# Altium footprint library cool_library.PcbLib: 1182 footprints (part 29 of 75)
Each footprint in its own frame and in the unit in brackets; x right, y up, seen from the top. Pads: shape width x height; smd on the part's side, far side on the other; paste and mask are expansions set on the pad; w line width, h text height; cw(c..) or ccw(c..) is an arc to the next point about the centre after c.
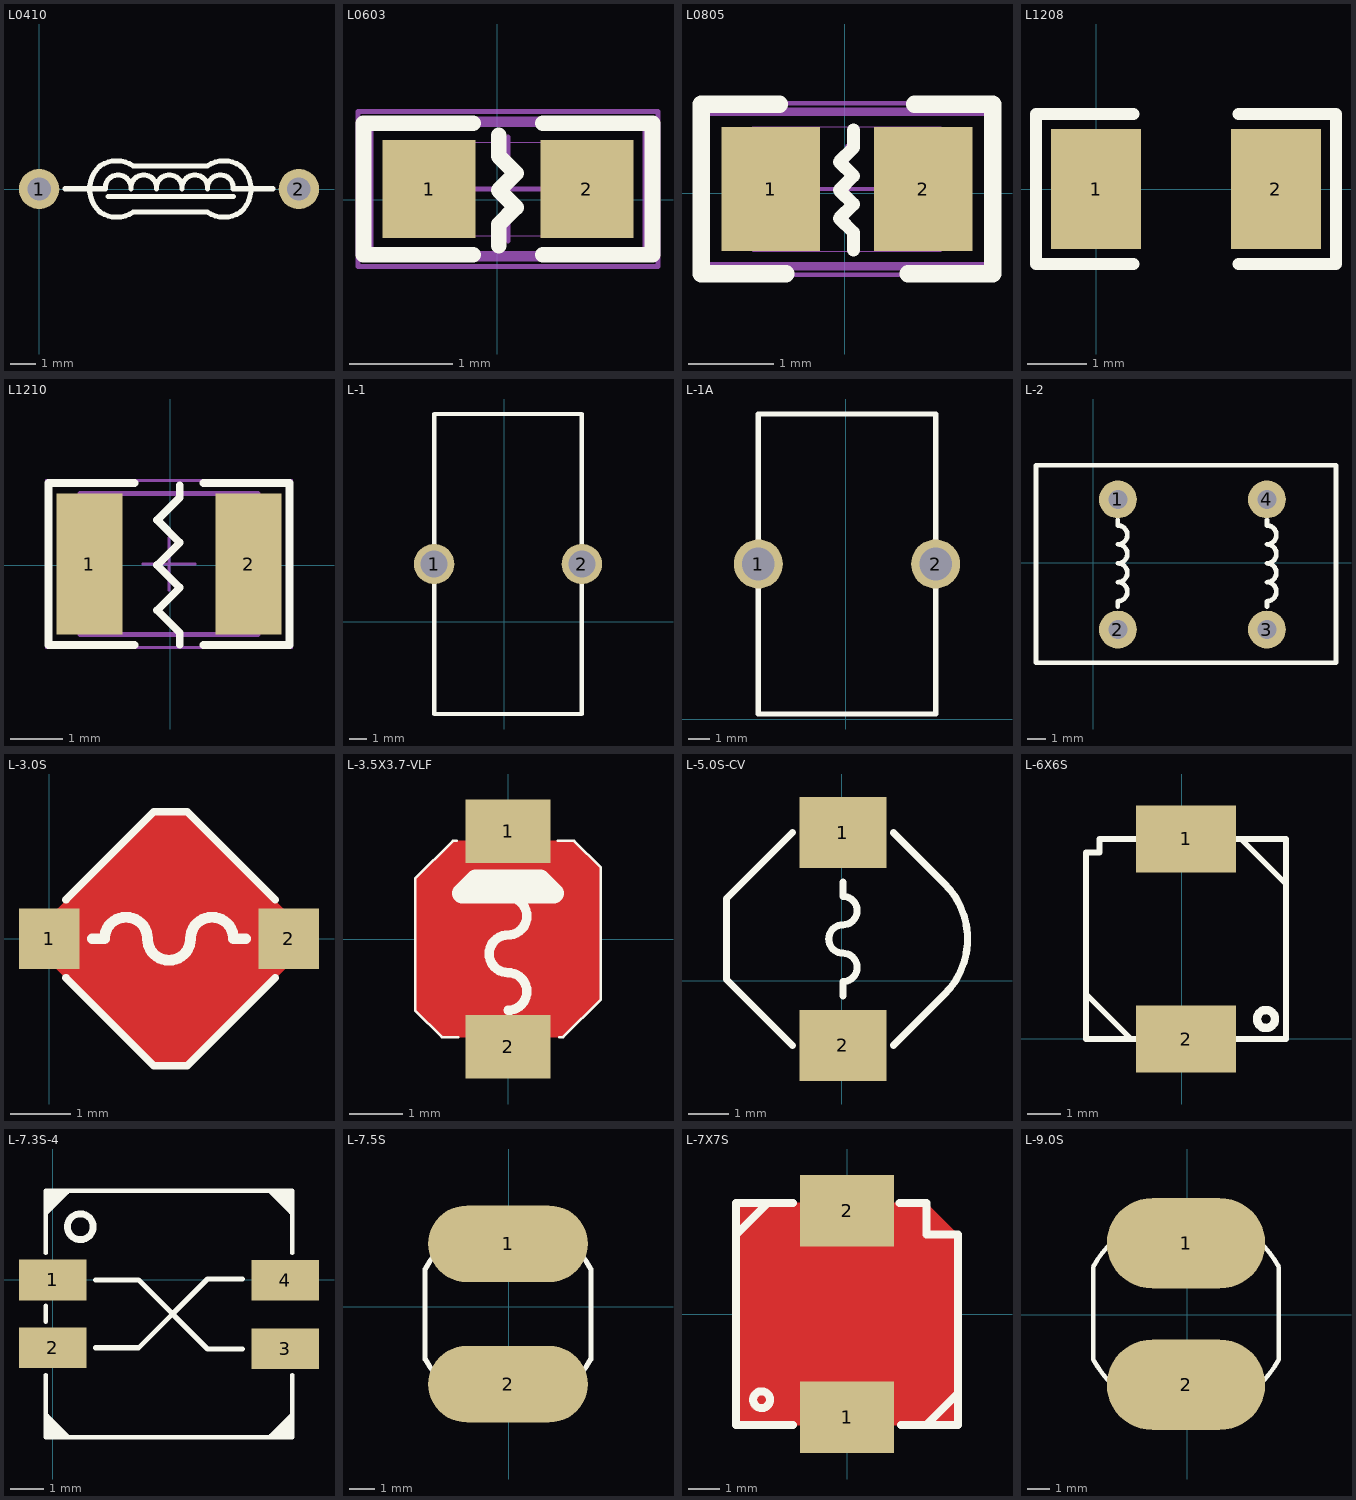
[diagram p28: the footprints below, top view; thin cyan lines are the x and y axes]

## L0410 [mil]
pads (2):
  round 62 hole 36: 1(0,0) 2(400,0)
Top Overlay:
  lines w7.87: 40,0.39 102.01,0.39 cw(c121.69,1.97) 141.38,0.39 cw(c161.06,1.97) 180.75,0.39 cw(c200.43,1.97) 220.12,0.39 cw(c239.8,1.97) 259.49,0.39 cw(c279.17,1.97) 298.86,0.39 360,0.39 ; 105.94,-11.42 298.86,-11.42 ; 93.74,-35.43 cw(c125.24,0) 93.74,35.43 cw(c119.33,-1.97) 144.92,35.43 259.09,35.43 cw(c284.68,-1.97) 310.27,35.43 cw(c278.82,0) 310.27,-35.43 cw(c284.68,1.94) 259.09,-35.43 144.92,-35.43 cw(c119.33,1.94) 93.74,-35.43

## L0603 [mm]
pads (2):
  rect 0.9x0.95 smd: 1(-0.66,0.102) 2(0.864,0.102)
Top Overlay:
  lines w0.152: -0.235,-0.533 -1.295,-0.533 -1.295,0.737 -0.235,0.737 ; 0.013,-0.445 0.013,-0.241 0.178,-0.076 0.013,0.089 0.178,0.254 0.013,0.419 0.013,0.622 ; 0.438,-0.533 1.499,-0.533 1.499,0.737 0.438,0.737
Mechanical 15:
  lines w0.1: -1.248,-0.548 -1.248,0.752 1.452,0.752 1.452,-0.548 -1.248,-0.548
  text "1" at -0.024,-0.243 h0.58
Mechanical 16:
  lines w0.001: -0.748,-0.348 -0.748,0.552 0.952,0.552 0.952,-0.348 -0.748,-0.348
  lines w0.05: -0.398,0.102 0.602,0.102 ; 0.102,-0.398 0.102,0.602 ; -1.348,-0.648 -1.348,0.852 1.552,0.852 1.552,-0.648 -1.348,-0.648
3D body: height 0.3, standoff 0, extent -0.698,-0.298 0.902,0.502

## L0805 [mm]
pads (2):
  rect 1.15x1.45 smd: 1(-0.864,0.051) 2(0.914,0.051)
Top Overlay:
  lines w0.152: 0.102,-0.66 0.102,-0.457 -0.064,-0.292 0.102,-0.127 -0.064,0.038 0.102,0.203 -0.064,0.368 0.102,0.533 0.102,0.737
  lines w0.203: -0.762,1.041 -1.676,1.041 -1.676,-0.94 -0.686,-0.94 ; 0.737,-0.94 1.727,-0.94 1.727,1.041 0.813,1.041
Mechanical 15:
  lines w0.1: -1.625,-0.849 -1.625,0.951 1.675,0.951 1.675,-0.849 -1.625,-0.849
  text "1" at -0.139,-0.399 h0.75
Mechanical 16:
  lines w0.001: -1.075,-0.674 -1.075,0.776 1.125,0.776 1.125,-0.674 -1.075,-0.674
  lines w0.05: -0.475,0.051 0.525,0.051 ; 0.025,-0.449 0.025,0.551 ; -1.725,-0.949 -1.725,1.051 1.775,1.051 1.775,-0.949 -1.725,-0.949

## L1208 [mil]
pads (2):
  rect 60x80 smd: 1(0,0) 2(120,0)
Top Overlay:
  lines w8: 25,-50 -40,-50 -40,50 25,50 ; 95,-50 160,-50 160,50 95,50

## L1210 [mil]
pads (2):
  rect 50x106.3 smd: 1(-61,1) 2(59,1)
Top Overlay:
  lines w6: -27,-60 -92,-60 -92,62 -27,62 ; 7.11,-59.89 7.11,-50.89 -9.89,-33.89 7.11,-16.89 -9.89,0.11 7.11,17.11 -9.89,34.11 7.11,51.11 7.11,60.11 ; 25,-60 90,-60 90,62 25,62
Mechanical 15:
  lines w3.94: -67.93,-52.15 -67.93,54.15 65.93,54.15 65.93,-52.15 -67.93,-52.15
  text "1" at -7.47,-16.71 h29.53
Mechanical 16:
  lines w0.04: -67.93,-52.15 -67.93,54.15 65.93,54.15 65.93,-52.15 -67.93,-52.15
  lines w1.97: -20.68,1 18.68,1 ; -1,-18.68 -1,20.68 ; -93.52,-61.99 -93.52,63.99 91.52,63.99 91.52,-61.99 -93.52,-61.99

## L-1 [mil]
pads (2):
  round 90 hole 60: 1(-157,129) 2(173,129)
Top Overlay:
  lines w10: -157,-206 -157,464 173,464 173,-206 -157,-206

## L-1A [mil]
pads (2):
  round 90 hole 60: 1(-160,285) 2(165,285)
Top Overlay:
  lines w10: -160,10 165,10 165,560 -160,560 -160,285 -160,10

## L-2 [mil]
pads (4):
  round 80 hole 40: 1(52,134) 2(52,-141) 3(367,-141) 4(367,134)
Top Overlay:
  lines w10: -121,205 -121,-211 513,-211 513,205 ; -121,206 513,206 ; 52,-93 52,-81 ccw(c52,-61) 52,-41 ccw(c52,-21) 52,-1 ccw(c52,19) 52,39 ccw(c52,59) 52,79 52,91 ; 367,-93 367,-81 ccw(c367,-61) 367,-41 ccw(c367,-21) 367,-1 ccw(c367,19) 367,39 ccw(c367,59) 367,79 367,91

## L-3.0S [mm]
height 1.5
pads (2):
  rect 1x1 smd: 1(0,0) 2(3.962,0)
Top Layer:
  pour cut-out: 1.702,2.057 1.702,2.083 2.286,2.083 4.089,0.279 4.14,0.279 4.14,-0.254 2.311,-2.083 1.753,-2.083 1.727,-2.108 -0.076,-0.305 -0.102,-0.305 -0.102,0.254
Top Overlay:
  lines w0.127: 0.276,-0.645 1.732,-2.1 2.282,-2.1 3.737,-0.645 ; 3.737,0.645 2.282,2.1 1.732,2.1 0.276,0.645 ; 0.276,0.645 0.276,0.645
  lines w0.178: 0.711,0 0.914,0 cw(c1.27,0) 1.27,0.356 cw(c1.27,0) 1.626,0 ccw(c1.981,0) 1.981,-0.356 ccw(c1.981,0) 2.337,0 cw(c2.692,0) 2.692,0.356 cw(c2.692,0) 3.048,0 3.251,0

## L-3.5X3.7-VLF [mm]
pads (2):
  rect 1.6x1.2 smd: 1(0,2.032) 2(0,-2.032)
Top Layer:
  pour cut-out: -1.041,1.854 1.245,1.854 1.753,1.346 1.753,-1.143 1.041,-1.854 -1.245,-1.854 -1.753,-1.346 -1.753,1.143
Top Overlay:
  lines w0.051: -0.965,1.854 -1.041,1.854 -1.753,1.143 -1.753,-1.346 -1.245,-1.854 -0.94,-1.854 ; 0.94,1.854 1.245,1.854 1.753,1.346 1.753,-1.143 1.041,-1.854 0.965,-1.854
  lines w0.178: 0,-1.346 ccw(c0,-0.991) 0.356,-0.991 ccw(c0,-0.991) 0,-0.635 cw(c0,-0.279) -0.356,-0.279 cw(c0,-0.279) 0,0.076 ccw(c0,0.432) 0.356,0.432 ccw(c0,0.432) 0,0.787 ; 0,0.965 0,1.219
  lines w0.381: -0.864,0.864 -0.61,1.118 0.61,1.118 0.864,0.864 -0.864,0.864

## L-5.0S-CV [mil]
pads (2):
  rect 86x70 smd: 1(1,146) 2(1,-64)
Top Overlay:
  lines w7: -48.95,-64.05 -114,1 -114,81 -48.95,146.05 ; 1,-15 1,-1 ccw(c1,13) 15,13 ccw(c1,13) 1,27 cw(c1,41) -13,41 cw(c1,41) 1,55 ccw(c1,69) 15,69 ccw(c1,69) 1,83 1,97 ; 51,-63.86 100.46,-14.39 ccw(c46.97,41) 100.46,96.39 51,145.86

## L-6X6S [mm]
pads (2):
  rect 3x2 smd: 1(0.13,5.994) 2(0.13,-0.006)
Top Overlay:
  circle w0.254: c2.53,0.594 r0.27
  lines w0.178: -2.87,1.344 -1.52,-0.006 ; 1.78,5.994 3.13,4.644 ; -2.87,-0.006 -2.87,5.594 -2.47,5.594 -2.47,5.994 3.13,5.994 3.13,-0.006 -2.87,-0.006

## L-7.3S-4 [mm]
height 3.3
pads (4):
  rect 2x1.2 smd: 1(0,0) 2(0,-2.007) 3(6.875,-2.039) 4(6.875,-0.007)
Top Overlay:
  circle w0.203: c0.813,1.575 r0.381
  lines w0.127: -0.213,-4.148 0.296,-4.657 ; -0.213,-2.81 -0.213,-4.657 ; -0.213,-1.235 -0.213,-0.762 ; -0.213,0.797 -0.213,2.643 ; -0.213,1.957 0.424,2.594 ; -0.213,2.135 0.296,2.643 ; -0.213,2.236 0.145,2.594 ; -0.213,2.338 -0.008,2.543 ; -0.163,-4.299 0.195,-4.657 ; -0.163,-4.02 0.474,-4.657 ; -0.112,-4.556 -0.213,-4.657 ; -0.112,-4.452 0.093,-4.657 ; -0.112,2.543 -0.213,2.643 ; 6.401,2.643 7.038,2.007 ; 6.451,-4.607 7.087,-3.97 ; 6.579,-4.657 7.087,-4.148 ; 6.579,2.643 7.087,2.135 ; 6.68,2.643 7.038,2.286 ; 6.73,-4.607 7.087,-4.249 ; 6.782,2.643 6.987,2.438 ; 6.882,-4.556 7.087,-4.351 ; 6.987,-4.556 7.087,-4.657 ; 6.987,2.543 7.087,2.643 ; 7.087,-2.81 7.087,-4.657 ; 7.087,0.797 7.087,2.643 ; -0.213,-4.657 7.087,-4.657 ; -0.213,2.643 7.087,2.643
  lines w0.152: 1.27,-2.007 2.54,-2.007 4.579,0.032 5.605,0.032 ; 1.27,0 2.54,0 4.579,-2.039 5.605,-2.039

## L-7.5S [mil]
pads (2):
  oval 250x120 smd: 1(-1,99) 2(-1,-121)
Top Overlay:
  lines w8: -131,-82 -131,59 ; -130.58,-81.77 ccw(c-1,-11) 128.58,-81.77 ; -130.58,59.77 cw(c-1,-11) 128.58,59.77 ; 129,-82 129,59

## L-7X7S [mil]
pads (2):
  rect 118.11x90 smd: 1(0,-130) 2(0,130)
Top Layer:
  pour cut-out: -140,140 -140,-140 140,-140 140,100 100,140
Top Overlay:
  circle w10: c-107.65,-108 r10.65
  lines w10: -140,100 -100,140 ; -68,-140 -140,-140 -140,140 -68,140 ; 66,140 100,140 100,100 140,100 140,-140 68,-140 ; 100,-140 140,-100

## L-9.0S [mil]
pads (2):
  oval 280x160 smd: 1(-2,126) 2(-2,-124)
Top Overlay:
  lines w8: -166.27,84 cw(c-2.13,-5.64) 162,84 ; -166,83 -166,-79 ccw(c-1.87,10.64) 162.27,-79 ; 162,-79 162,83